# Altium footprint library highpower.PcbLib: 29 footprints (part 1 of 2)
Each footprint in its own frame and in the unit in brackets; x right, y up, seen from the top. Pads: shape width x height; smd on the part's side, far side on the other; paste and mask are expansions set on the pad; w line width, h text height; cw(c..) or ccw(c..) is an arc to the next point about the centre after c.
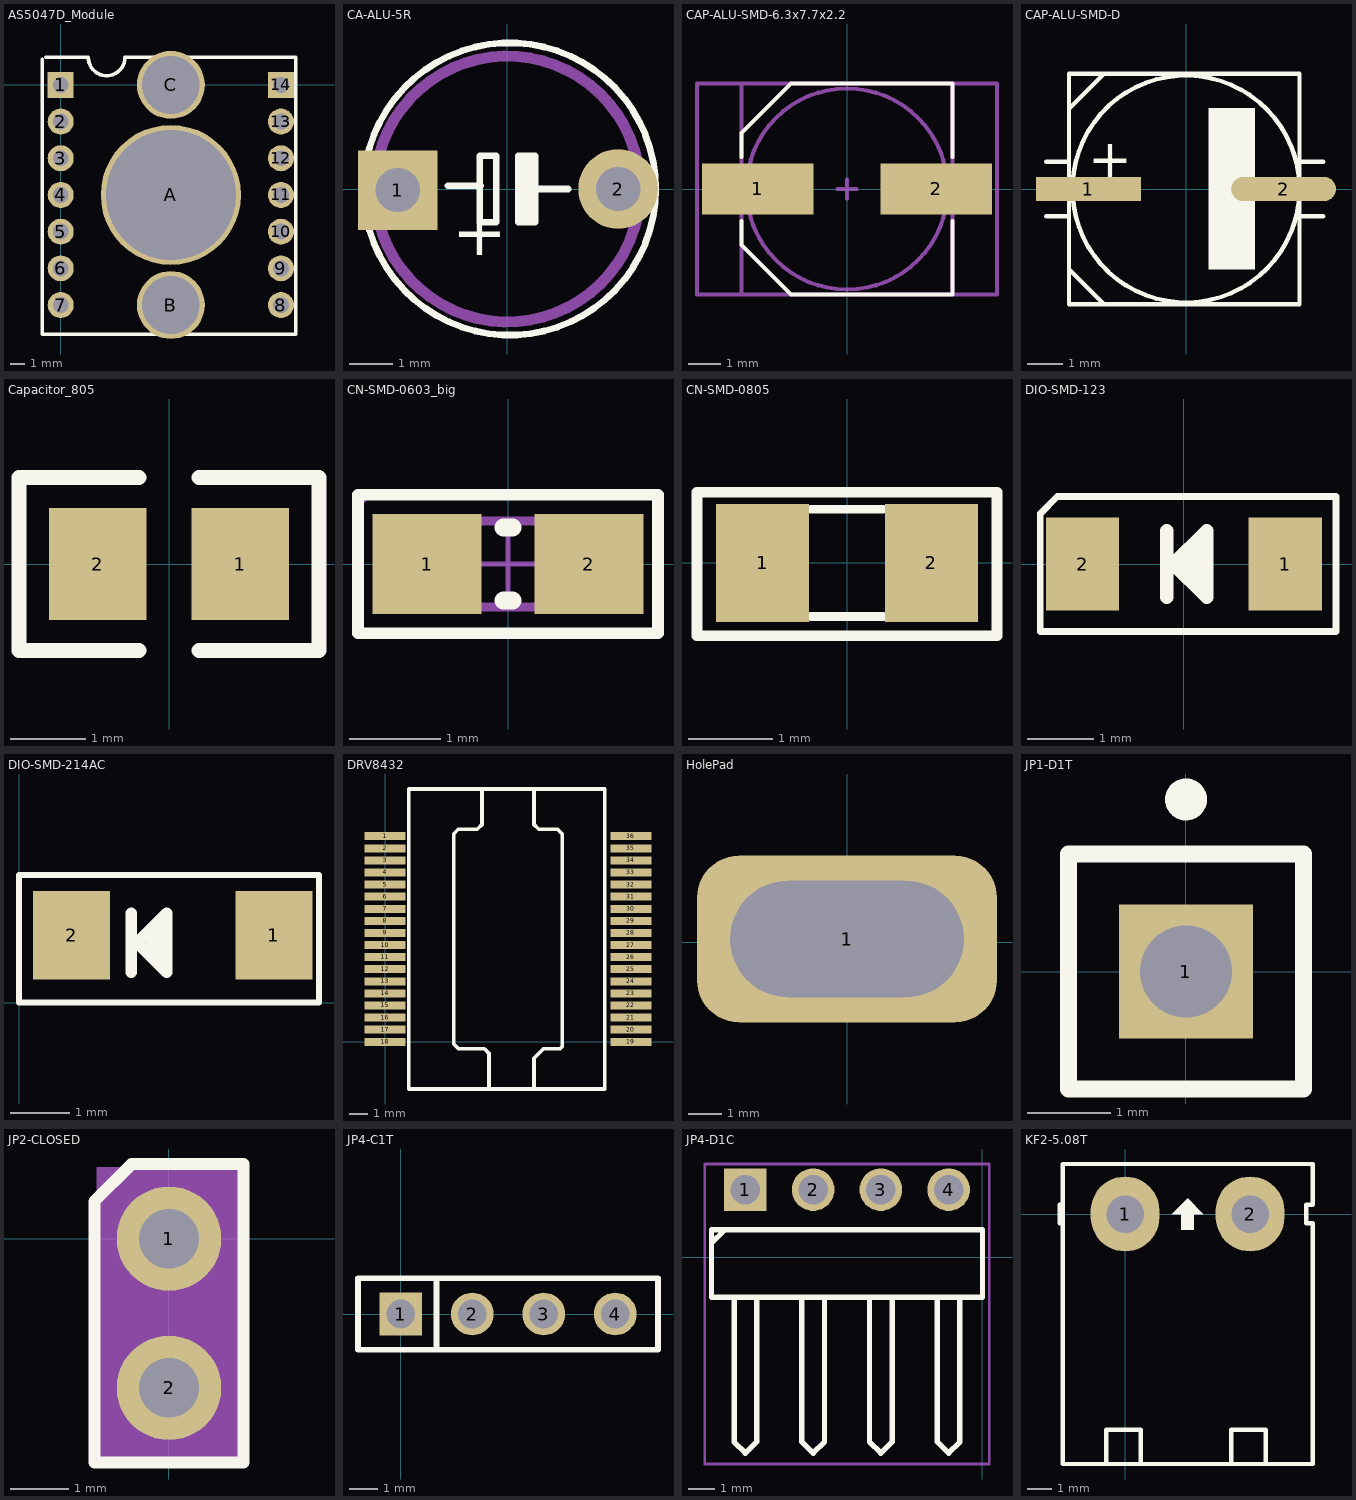
[diagram p0: the footprints below, top view; thin cyan lines are the x and y axes]

## AS5047D_Module [mm] "PCB Breakout"
pads (17):
  rect 1.8x1.8 hole 1.1: 1(0,0) 14(15.24,0)
  round 1.8 hole 1.1: 2(0,-2.54) 3(0,-5.08) 4(0,-7.62) 5(0,-10.16) 6(0,-12.7) 7(0,-15.24) 8(15.24,-15.24) 9(15.24,-12.7) 10(15.24,-10.16) 11(15.24,-7.62) 12(15.24,-5.08) 13(15.24,-2.54)
  round 9.7 hole 9: A(7.62,-7.62)
  round 4.7 hole 4: B(7.62,-15.24) C(7.62,0)
Top Overlay:
  lines w0.254: -1.27,1.778 -1.27,-17.272 16.256,-17.272 16.256,1.905 4.572,1.905 ; -1.016,1.905 1.905,1.905 ccw(c3.175,1.905) 4.445,1.905

## CA-ALU-5R [mil]
pads (2):
  rect 72x72 hole 40: 1(-99,-1)
  round 72 hole 40: 2(100,0)
Top Overlay:
  circle w6: c2,0 r132
  rectangle: 9.99,-30 24.99,30
  lines w6: 25,0 25,30 10,30 10,0 10,-30 25,-30 25,0 ; 25,0 55,0 25,0 ; -54,3 -24,3 -54,3 ; -25,-30 -25,0 -25,30 -10,30 -10,0 -10,-30 -25,-30
  text "+" at -50,-60 h43.31
Mechanical 1:
  circle w10: c0,0 r120
3D body "5x13.step": height 551.18, standoff -80.55, extent -108.26,-98.42 108.28,98.43

## CAP-ALU-SMD-6.3x7.7x2.2 [mm]
height 7.7
pads (2):
  rect 3.5x1.6 smd: 1(-2.8,0) 2(2.8,0)
Top Overlay:
  lines w0.127: -3.3,-1 -3.3,-1.75 -1.75,-3.3 3.3,-3.3 3.3,-1 ; -3.3,1 -3.3,1.75 -1.75,3.3 3.3,3.3 3.3,1
Mechanical 13:
  circle w0.127: c0,0 r3.15
  lines w0.127: -3.3,-3.3 3.3,-3.3 3.3,3.3 -3.3,3.3 -3.3,-3.3
Mechanical 15:
  lines w0.127: -0.3,0 0.3,0 ; 0,-0.3 0,0.3 ; -4.699,-3.302 4.699,-3.302 4.699,3.302 -4.699,3.302 -4.699,-3.302
3D body "6.3x7.7x2.2.stp": height 7.65, standoff -0.05, extent -3.65,-3.3 3.65,3.3

## CAP-ALU-SMD-D [mm]
pads (2):
  rect 3x0.7 smd: 1(-2.794,0)
  oval 3x0.7 smd: 2(2.794,0)
Top Overlay:
  circle w0.127: c0,0 r3.25
  rectangle: 0.65,-2.3 1.975,2.325
  lines w0.127: -4,-0.775 -3.35,-0.775 ; -4,0.775 -3.35,0.775 ; -3.35,-2.65 -3.35,0 ; -3.35,-2.3 -2.35,-3.3 ; -3.35,2.3 -2.35,3.3 ; 3.25,-0.775 3.925,-0.775 ; 3.25,0.775 3.925,0.775 ; -3.35,-3.3 -3.35,0 ; -3.35,-3.3 -3.35,-3.3 ; -3.35,-3.3 3.25,-3.3 3.25,0 3.25,3.3 -3.35,3.3 -3.35,0
  text "+" at -2.8,0.325 h1.1
3D body "User Library-ALU-D.STEP": height 5.4, standoff 0, extent -3.5,-3.3 3.5,3.3

## Capacitor_805 [mm]
height 10.95
pads (2):
  rect 1.3x1.5 smd: 1(0.95,0) 2(-0.95,0)
Top Overlay:
  lines w0.2: -0.4,-1.15 -2,-1.15 -2,1.15 -0.4,1.15 ; 0.4,-1.15 2,-1.15 2,1.15 0.4,1.15
3D body "User Library-0805 SMD Capacitor_.STEP": height 0.78, standoff 0, extent -1,-0.625 1,0.625

## CN-SMD-0603_big [mm]
pads (2):
  rect 1.2x1.1 smd: 1(-0.889,0) 2(0.889,0)
Top Overlay:
  lines w0.127: -1.651,-0.762 -1.651,0.762 1.651,0.762 1.651,-0.762 -1.651,-0.762
  lines w0.2: -0.05,-0.4 0.05,-0.4 ; -0.05,0.4 0.05,0.4
Mechanical 13:
  lines w0.1: -0.875,-0.475 -0.875,0.475 0.875,0.475 0.875,-0.475 -0.875,-0.475
Mechanical 15:
  lines w0.05: -0.475,0 0.475,0 ; 0,-0.475 0,0.475 ; -1.651,-0.75 1.651,-0.75 1.651,0.75 -1.536,0.75 -1.651,0.635 -1.651,-0.75
3D body "User Library-0603 SMD Capacitor.step": height 0.3, standoff 0, extent -0.8,-0.4 0.8,0.4

## CN-SMD-0805 [mm]
pads (2):
  rect 1.1x1.397 smd: 1(-1,0) 2(1,0)
Top Overlay:
  lines w0.102: -0.432,-0.635 0.432,-0.635 ; -0.432,0.635 0.432,0.635
  lines w0.127: -1.778,-0.864 1.778,-0.864 1.778,0.838 -1.778,0.838 -1.778,-0.864
3D body "0805 SMD Capacitor.step": height 0.8, standoff 0.02, extent -1,-0.625 1,0.625

## DIO-SMD-123 [mm]
pads (2):
  rect 1.1x1.4 smd: 1(1.524,0) 2(-1.524,0)
Top Overlay:
  lines w0.102: -2.159,-1.016 -2.159,0.762 -1.905,1.016 2.286,1.016 2.286,-1.016 -2.159,-1.016
  lines w0.2: -0.257,-0.5 -0.257,0.5 ; 0.093,-0.15 0.093,0.15 ; 0.243,-0.3 0.243,0.3 ; -0.157,0 0.343,-0.5 0.343,0.5 -0.157,0
3D body "User Library-SOD-123.step": height 1.25, standoff 0, extent -1.756,-0.8 1.942,0.8

## DIO-SMD-214AC [mm] "DO-214AC , ES1J"
pads (2):
  rect 1.3x1.5 smd: 1(4.318,1.143) 2(0.889,1.143)
Top Overlay:
  lines w0.102: 0,0 0,2.159 5.08,2.159 5.08,0 0,0
  lines w0.2: 1.902,0.516 1.902,1.516 ; 2.252,0.866 2.252,1.166 ; 2.402,0.716 2.402,1.316 ; 2.002,1.016 2.502,0.516 2.502,1.516 2.002,1.016
3D body "User Library-SOD-123.step": height 1.25, standoff 0, extent 0.403,0.216 4.101,1.816

## DRV8432 [mm]
pads (36):
  rect 2.2x0.43 smd paste+0: 1(0,11.05)
  rect 2.2x0.43 smd: 2(0,10.4) 3(0,9.75) 4(0,9.1) 5(0,8.45) 6(0,7.8) 7(0,7.15) 8(0,6.5) 9(0,5.85) 10(0,5.2) 11(0,4.55) 12(0,3.9) 13(0,3.25) 14(0,2.6) 15(0,1.95) 16(0,1.3) 17(0,0.65) 18(0,0) 19(13.208,0) 20(13.208,0.65) 21(13.208,1.3) 22(13.208,1.95) 23(13.208,2.6) 24(13.208,3.25) 25(13.208,3.9) 26(13.208,4.55) 27(13.208,5.2) 28(13.208,5.85) 29(13.208,6.5) 30(13.208,7.15) 31(13.208,7.8) 32(13.208,8.45) 33(13.208,9.1) 34(13.208,9.75) 35(13.208,10.4) 36(13.208,11.05)
Top Overlay:
  lines w0.2: 3.683,11.049 3.683,11.176 ; 3.873,11.367 3.683,11.176 ; 3.937,11.43 4.191,11.43 4.953,11.43 5.207,11.684 5.207,13.462 ; 5.588,-2.54 5.588,-0.635 5.334,-0.381 3.937,-0.381 3.683,-0.127 3.683,1.143 3.683,11.176 ; 8.001,-2.54 8.001,-0.889 8.509,-0.381 9.398,-0.381 9.525,-0.254 9.525,1.651 ; 8.001,13.462 8.001,11.684 8.255,11.43 9.271,11.43 9.525,11.176 9.525,1.524 ; 1.27,-2.54 1.27,13.589 11.811,13.589 11.811,-2.54 1.27,-2.54
3D body "User Library-DRV8432.STEP": height 3.71, standoff -0.29, extent -0.773,-2.411 13.727,13.589

## HolePad [mm]
pads (1):
  rrect50% 9x5 hole 3.5 slot 7 at 0 deg: 1(0,0.1)

## JP1-D1T [mm] "1pins, 1 row, straight, gold plating"
height 8.54
pads (1):
  rect 1.6x1.6 hole 1.1: 1(0,0)
Top Overlay:
  circle w0.25: c0,2.05 r0.125
  lines w0.2: -1.4,-1.4 1.4,-1.4 1.4,1.4 -1.4,1.4 -1.4,-1.4
3D body "61300111121.stp": height 8.54, standoff -3, extent -1.27,-1.27 1.27,1.27

## JP2-CLOSED [mil]
pads (2):
  round 70 hole 40: 1(0,0) 2(0,-100)
Top Overlay:
  lines w8: -50,-150 50,-150 50,50 -25,50 -50,25 -50,-150
Mechanical 2:
  rectangle: -48,-151 49.5,48
Mechanical 3:
  rectangle: -48.5,-148 48.5,48
3D body: height 300, standoff -120, extent -15,-115.25 15,-85.25
3D body: height 300, standoff -120, extent -15,-15.25 15,14.75
3D body: height 100, standoff 0, extent -50,-150.43 50,50
3D body: height 220, standoff 100, extent -48,-152 48,48
3D body: height 250, standoff 220, extent -41,-144 40,39.5
3D body: height 280, standoff 250, extent -48,-152 48,48

## JP4-C1T [mm] "4 row, straight, gold plating"
height 8.5
pads (4):
  rect 1.52x1.52 hole 1.02: 1(0,0)
  round 1.52 hole 1.02: 2(2.54,0) 3(5.08,0) 4(7.62,0)
Top Overlay:
  lines w0.2: 1.27,-1.27 1.27,1.27 ; -1.52,-1.27 9.14,-1.27 9.14,1.27 -1.52,1.27 -1.52,-1.27
3D body "61300411821.stp": height 8.51, standoff -3.09, extent -1.52,-1.25 9.14,1.25

## JP4-D1C [mm] "4 pins, 1 row, right angled, gold plating"
height 2.54
pads (4):
  rect 1.6x1.6 hole 1.1: 1(-8.89,2.54)
  round 1.6 hole 1.1: 2(-6.35,2.54) 3(-3.81,2.54) 4(-1.27,2.54)
Top Overlay:
  lines w0.2: -10.118,0.574 -9.694,0.998 ; -9.313,-1.525 -9.313,-6.919 -8.89,-7.342 -8.467,-6.919 -8.467,-1.5 ; -6.773,-1.525 -6.773,-6.919 -6.35,-7.342 -5.927,-6.919 -5.927,-1.525 ; -4.233,-1.525 -4.233,-6.919 -3.81,-7.342 -3.387,-6.919 -3.387,-1.5 ; -1.693,-1.525 -1.693,-6.919 -1.27,-7.342 -0.847,-6.919 -0.847,-1.525 ; -10.16,-1.5 -10.16,1.04 0,1.04 0,-1.5 -10.16,-1.5
Mechanical 15:
  lines w0.1: -10.41,-7.75 0.25,-7.75 0.25,3.5 -10.41,3.5 -10.41,-7.75
3D body "61300411021.stp": height 2.54, standoff -3, extent -10.16,-7.566 0,2.794

## KF2-5.08T [mil] "Header 2, 2 pin, hight 300mil, Pin to Pin 200, Colour Green"
height 300
pads (2):
  oval 110x120 hole 60: 1(0,0) 2(200,0)
Top Overlay:
  region: 100,25 75,0 90,0 90,-25 110,-25 110,0 125,0
  lines w7: -105,-15 -105,15 ; -30,-400 -30,-345 25,-345 25,-400 ; 170,-400 170,-345 225,-345 225,-400 ; -100,-400 -100,80 -18.5,80 180.5,80 300,80 300,15 290,15 290,-15 300,-15 300,-400 -100,-400
3D body "SW3dPS-5EHDR_2P.STEP": height 333.51, standoff -157.48, extent -96.7,-399.22 297,73.22